# Altium footprint library my Library.PcbLib: 1247 footprints (part 51 of 78)
Each footprint in its own frame and in the unit in brackets; x right, y up, seen from the top. Pads: shape width x height; smd on the part's side, far side on the other; paste and mask are expansions set on the pad; w line width, h text height; cw(c..) or ccw(c..) is an arc to the next point about the centre after c.
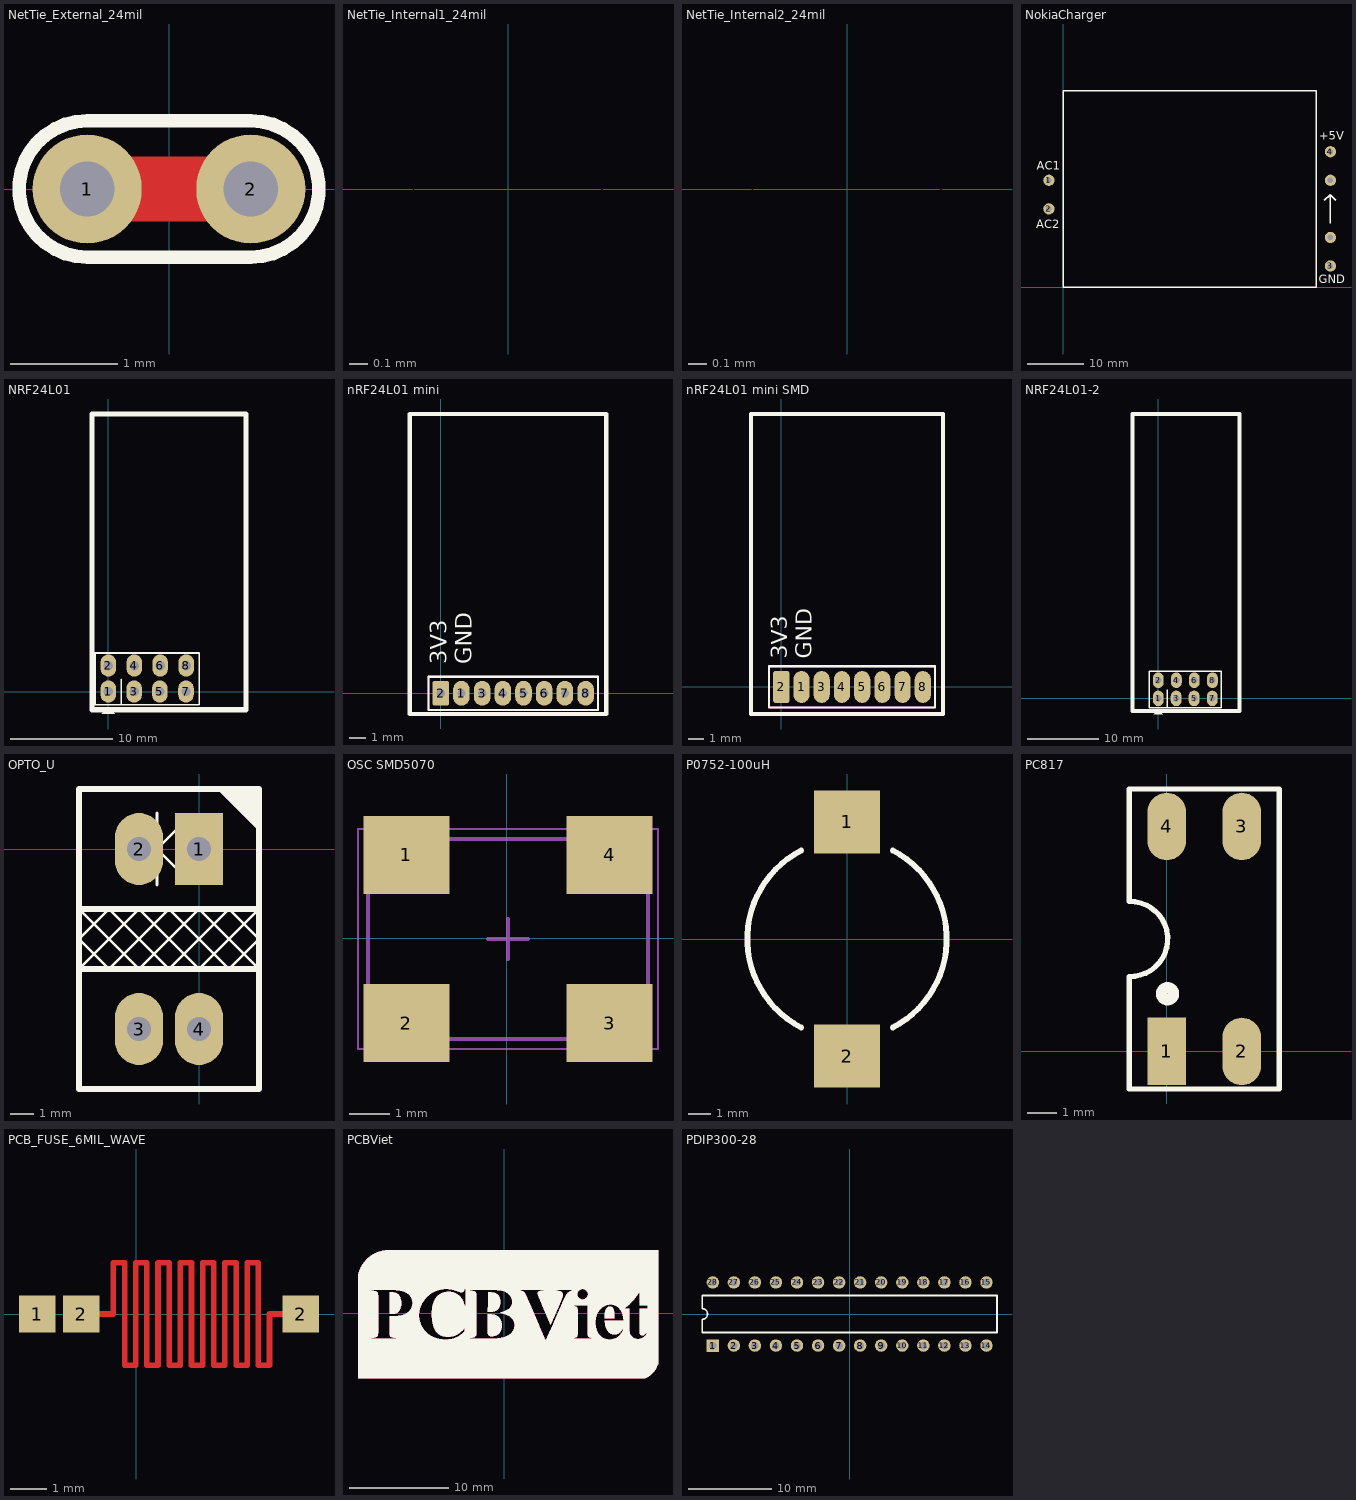
[diagram p50: the footprints below, top view; thin cyan lines are the x and y axes]

## NetTie_External_24mil [mil]
pads (2):
  round 40 hole 20: 1(-30,0) 2(30,0)
Top Layer:
  lines w24: -30,0 30,0
Top Overlay:
  lines w5: -30,-25 cw(c-30,0) -30,25 30,25 cw(c30,0) 30,-25 -30,-25
Top Solder:
  rectangle: -30,-18 30,18

## NetTie_Internal1_24mil [mil]
pads (2):
  round 24 on Mid1: 1(-20,0) 2(20,0)
Mid-Layer 1:
  lines w24: -20,0 20,0

## NetTie_Internal2_24mil [mil]
pads (2):
  round 24 on Mid2: 1(-20,0) 2(20,0)
Mid-Layer 2:
  lines w24: -20,0 20,0

## NokiaCharger [mm]
pads (6):
  round 2 hole 1: 1(-2.54,19.05) 2(-2.54,13.97) 3(47.54,3.81) 4(47.54,24.13) TEMP(47.54,8.89) TEMP(47.54,19.05)
Top Overlay:
  lines w0.254: 46.482,15.494 47.498,16.51 ; 47.498,11.43 47.498,16.51 ; 48.514,15.494 47.498,16.51 ; 0,0 45,0 ; 0,0 45,0 ; 0,0 0,35 ; 0,35 45,35 ; 0,35 45,35 ; 45,0 45,35
  text "AC2" at -4.826,10.541 h1.52
  text "AC1" at -4.699,20.955 h1.52
  text "+5V" at 45.593,26.289 h1.52
  text "GND" at 45.466,0.762 h1.52

## NRF24L01 [mil]
pads (8):
  oval 60x86 hole 36: 1(0,0) 2(0,100) 3(99,0) 4(100,100) 5(198,0) 6(199.5,100) 7(299,0) 8(300,100)
Top Overlay:
  region: -0.5,-61.5 -25.5,-86.5 24.5,-86.5
  lines w7: 49.5,-50.5 49.5,47.5 ; -51,-51 -51,49 -51,149 350,149 350,-51 -51,-51
  lines w20: -63,-70 -63,1069.2 530,1069.2 530,-70 -63,-70
3D body "User Library-MY-NRF24L01P.STEP": height 587.8, standoff 0.73, extent -73,-73.7 517.55,1068.03

## nRF24L01 mini [mil] "Connector; Header; 6 Position, 0.050\" pitch"
pads (8):
  oval 40x60 hole 20: 1(50,0) 3(100,0) 4(150,0) 5(200,0) 6(250,0) 7(300,0) 8(350,0)
  rrect25% 40x60 hole 20: 2(0,0)
Top Overlay:
  lines w5: -30,-40 -30,40 380,40 380,-40 -30,-40
  lines w10: -75,-50 400,-50 400,675 -75,675 -75,-50
  text "3V3" at 15,70 h40
  text "GND" at 75,70 h40
Bottom Solder:
  rectangle: 0,-30 350,30
Mechanical 13:
  lines w5: -30,-40 -30,40 380,40 380,-40 -30,-40

## nRF24L01 mini SMD [mm] "Connector; Header; 6 Position, 0.050\" pitch"
pads (8):
  oval 1.016x2 smd: 1(1.27,0) 3(2.54,0) 4(3.81,0) 5(5.08,0) 6(6.35,0) 7(7.62,0) 8(8.89,0)
  rrect25% 1.016x2 smd: 2(0,0)
Top Overlay:
  lines w0.127: -0.762,-1.3 -0.762,1.3 9.652,1.3 9.652,-1.3 -0.762,-1.3
  lines w0.254: -1.905,-1.7 10.16,-1.7 10.16,17.145 -1.905,17.145 -1.905,-1.7
  text "3V3" at 0.381,1.778 h1.02
  text "GND" at 1.905,1.778 h1.02
Bottom Solder:
  rectangle: 0,-0.762 8.89,0.762
Mechanical 13:
  lines w0.127: -0.762,-1.3 -0.762,1.3 9.652,1.3 9.652,-1.3 -0.762,-1.3

## NRF24L01-2 [mil]
pads (8):
  oval 60x86 hole 36: 1(0,0) 2(0,100) 3(99,0) 4(100,100) 5(198,0) 6(199.5,100) 7(299,0) 8(300,100)
Top Overlay:
  region: -0.5,-61.5 -25.5,-86.5 24.5,-86.5
  lines w7: 49.5,-50.5 49.5,47.5 ; -51,-51 -51,49 -51,149 350,149 350,-51 -51,-51
  lines w20: -143,-70 -143,1574.8 450,1574.8 450,-70 -143,-70

## OPTO_U [mil] "Opto hinh chu U"
height 104.33
pads (4):
  rect 80x120 hole 40: 1(0,0)
  oval 80x120 hole 40: 2(-100,0) 3(-100,-300) 4(0,-300)
Top Overlay:
  region: 97.5,97.5 32.5,97.5 97.5,32.5
  lines w5: -200,-200 -150,-150 -100,-100 0,-200 30,-170 100,-100 100,-200 0,-100 -100,-200 -110,-190 -140,-160 -200,-100 ; -70,-60 -70,60 ; -20,-50 -70,0 -20,50 ; -20,-50 -20,50 ; -20,-50 -20,50 ; -200,-150 -150,-100 -50,-200 50,-100 100,-150 50,-200 -50,-100 -150,-200 -170,-180 -200,-150
  lines w10: -200,-200 100,-200 ; -200,-150 -200,-110 ; -200,-100 100,-100 ; 100,-150 100,-140 ; -200,-400 -200,100 100,100 100,-400 -200,-400
3D body "SW3dPS-ee-sx-1041.STEP": height 394.3, standoff -196.25, extent -166,-430.59 70.22,120.59

## OSC SMD5070 [mm]
height 1.1
pads (4):
  rect 2.15x1.95 smd: 1(-2.504,2.077) 2(-2.504,-2.123) 3(2.576,-2.123) 4(2.576,2.077)
Top Overlay:
  circle w0.1: c-3.464,2.877 r0.05
Mechanical 13:
  lines w0.1: -3.464,-2.523 -3.464,2.477 3.536,2.477 3.536,-2.523 -3.464,-2.523
Mechanical 15:
  lines w0.05: -3.714,-2.773 -3.714,2.727 3.786,2.727 3.786,-2.773 -3.714,-2.773
  lines w0.1: -0.464,-0.023 0.536,-0.023 ; 0.036,-0.523 0.036,0.477
3D body "User Library-cwx815.STEP": height 1, standoff -0.01, extent -3.614,-2.423 3.686,2.377

## P0752-100uH [mil]
pads (2):
  rect 115x110 smd: 1(0,205) 2(0,-205)
Top Overlay:
  lines w10: -80.14,-154.93 cw(c0,0) -80,155 ; 80,-155 ccw(c0,0) 80.14,154.93
3D body "SW3dPS-P0752.STEP": height 187.01, standoff 0, extent -182.09,-248.03 182.09,248.04

## PC817 [mm] "4 PIN, W 300mil, Pin to pin 100mil"
height 2.54
pads (4):
  rect 1.3x2.286 smd: 1(0,0)
  oval 1.3x2.286 smd: 2(2.54,0) 3(2.54,7.62) 4(0,7.62)
Top Overlay:
  circle w0.381: c0.025,1.956 r0.203
  lines w0.178: -1.28,2.541 ccw(c-1.237,3.81) -1.27,5.08 ; -1.27,2.54 -1.27,-1.27 3.81,-1.27 3.81,8.89 -1.27,8.89 -1.27,5.105
3D body "SW3DPS-DIP4-DEFAULT.STEP": height 4.31, standoff -3.28, extent -1.5,-0.254 4.04,7.746

## PCA82CA250 [mm]

## PCB_FUSE_6MIL_WAVE [mm] "PCB Fuse, 6 mils wide, fuse time depends on substrate and current"
pads (3):
  rrect1% 1x1 smd paste-2: 1(-2.7,0) 2(-1.5,0) 2(4.5,0)
Top Layer:
  lines w0.152: -1,0 -0.619,0 -0.619,1.4 -0.314,1.4 -0.314,-1.4 -0.01,-1.4 -0.01,1.4 0.295,1.4 0.295,-1.4 0.6,-1.4 0.6,1.4 0.905,1.4 0.905,-1.4 1.21,-1.4 1.21,1.4 1.514,1.4 1.514,-1.4 1.819,-1.4 1.819,1.4 2.124,1.4 2.124,-1.4 2.429,-1.4 2.429,1.4 2.734,1.4 2.734,-1.4 3.038,-1.4 3.038,1.4 3.343,1.4 3.343,-1.4 3.648,-1.4 3.648,0 4,0
3D body: height 0.05, standoff 0, extent -3.2,-0.5 5,0.5

## PCBViet [mm]
Top Layer:
  drawing of 2360 lines, arcs and shapes, not listed
Bottom Layer:
  drawing of 2360 lines, arcs and shapes, not listed
Top Overlay:
  drawing of 2360 lines, arcs and shapes, not listed

## PDIP300-28 [mm] "DIP, Plastic, Skinny; 28 Leads; Row Spacing 7.62 mm; Pitch 2.54 mm"
height 4.07
pads (28):
  rect 1.5x1.5 hole 0.9: 1(-16.51,-3.81)
  round 1.5 hole 0.9: 2(-13.97,-3.81) 3(-11.43,-3.81) 4(-8.89,-3.81) 5(-6.35,-3.81) 6(-3.81,-3.81) 7(-1.27,-3.81) 8(1.27,-3.81) 9(3.81,-3.81) 10(6.35,-3.81) 11(8.89,-3.81) 12(11.43,-3.81) 13(13.97,-3.81) 14(16.51,-3.81) 15(16.51,3.81) 16(13.97,3.81) 17(11.43,3.81) 18(8.89,3.81) 19(6.35,3.81) 20(3.81,3.81) 21(1.27,3.81) 22(-1.27,3.81) 23(-3.81,3.81) 24(-6.35,3.81) 25(-8.89,3.81) 26(-11.43,3.81) 27(-13.97,3.81) 28(-16.51,3.81)
Top Overlay:
  lines w0.2: -17.78,-2.225 -17.78,-0.635 ccw(c-17.78,0) -17.78,0.635 -17.78,2.225 17.78,2.225 17.78,-2.225 -17.78,-2.225